# Altium footprint library PcbLib1.PcbLib: 212 footprints (part 4 of 14)
Each footprint in its own frame and in the unit in brackets; x right, y up, seen from the top. Pads: shape width x height; smd on the part's side, far side on the other; paste and mask are expansions set on the pad; w line width, h text height; cw(c..) or ccw(c..) is an arc to the next point about the centre after c.
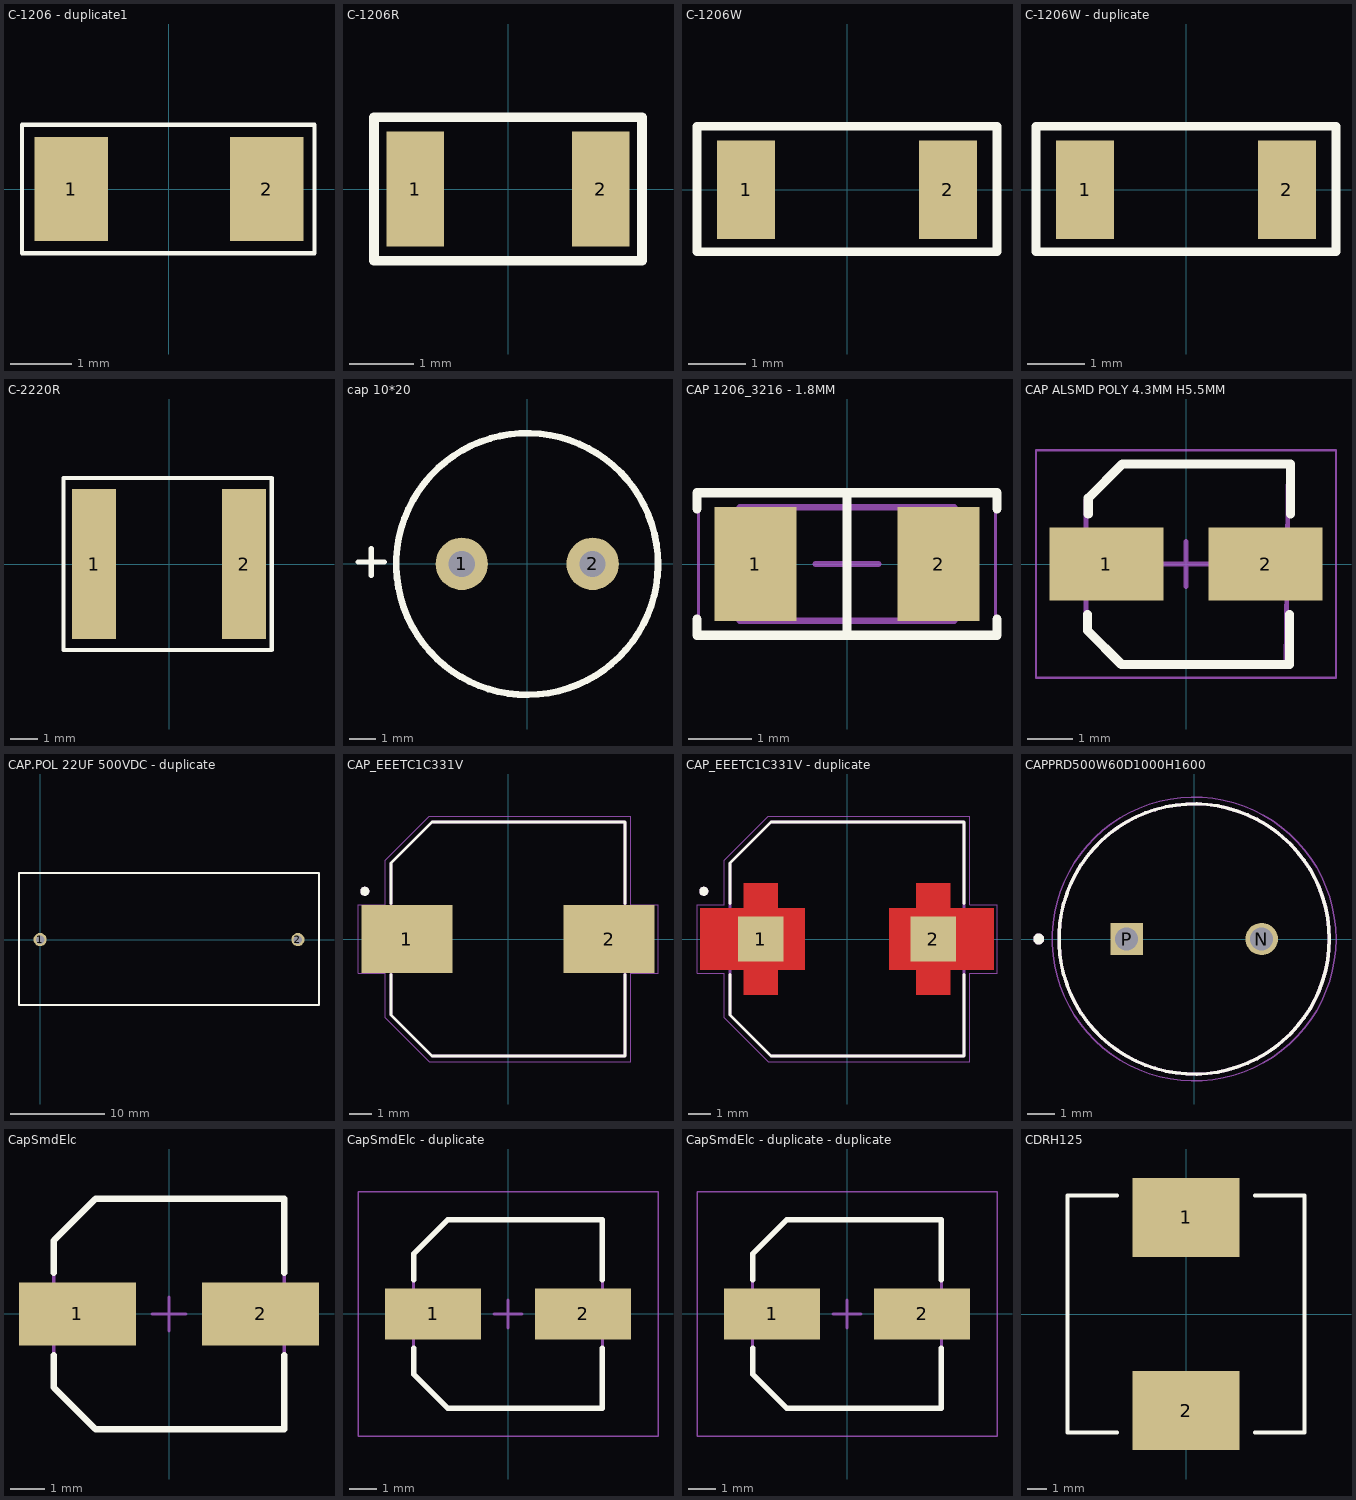
[diagram p3: the footprints below, top view; thin cyan lines are the x and y axes]

## C-1206 - duplicate1 [mm]
pads (2):
  rect 1.2x1.7 smd: 1(-1.6,0) 2(1.6,0)
Top Overlay:
  lines w0.07: -2.4,-1.05 -2.4,1.05 2.375,1.05 2.375,0.692 2.375,0.556 2.375,-0.531 2.375,-1.05 -2.4,-1.05
3D body "User Library-CAPC3216X10.STEP": height 1, standoff 0, extent -1.6,-0.8 1.6,0.8

## C-1206R [mm] "capacitor 1206 reflow soldering"
pads (2):
  rect 0.9x1.8 smd: 1(-1.45,0) 2(1.45,0)
Top Overlay:
  lines w0.152: -2.1,-1.125 -2.1,1.125 1.13,1.125 2.1,1.125 2.1,-1.125 -2.1,-1.125
3D body "CAP1206.stp": height 1, standoff 0, extent -1.6,-0.8 1.6,0.8

## C-1206W [mm] "capacitor 1206 wave soldering"
pads (2):
  rect 1x1.7 smd: 1(-1.75,0) 2(1.75,0)
Top Overlay:
  lines w0.152: -2.6,-1.075 2.45,-1.075 2.6,-1.075 2.6,1.1 -2.6,1.1 -2.6,-1.075
3D body "CAP1206.stp": height 1, standoff 0, extent -1.6,-0.8 1.6,0.8

## C-1206W - duplicate [mm] "capacitor 1206 wave soldering"
pads (2):
  rect 1x1.7 smd: 1(-1.75,0) 2(1.75,0)
Top Overlay:
  lines w0.152: -2.6,-1.075 -2.6,1.1 2.6,1.1 2.6,-1.075 2.45,-1.075 -2.6,-1.075
3D body "CAP1206.stp": height 1, standoff 0, extent -1.6,-0.8 1.6,0.8

## C-2220R [mm] "capacitor 2220 reflow soldering"
pads (2):
  rect 1.6x5.4 smd: 1(-2.7,0) 2(2.7,0)
Top Overlay:
  lines w0.152: 2.15,-3.1 3.7,-3.1 3.7,3.1 2.15,3.1 ; 2.275,-3.1 -3.8,-3.1 -3.8,3.1 2.525,3.1
3D body "CAP2220.stp": height 2.24, standoff -0.04, extent -2.85,-2.5 2.85,2.5

## cap 10*20 [mm]
pads (2):
  round 2 hole 1: 1(-2.5,0) 2(2.5,0)
Top Overlay:
  lines w0.2: -6.466,0.075 -5.45,0.075 ; -5.958,-0.433 -5.958,0.583
  lines w0.254: 4.996,-0.08 cw(c-0.003,-0.004) 4.997,-0.004
3D body "User Library-CE_R200_D400_H800.STEP": height 20.33, standoff -2.89, extent -5.225,-5.025 4.935,5.134

## CAP 1206_3216 - 1.8MM [mm] "Chip Capacitor, 2-Leads, Body 3.25x1.60mm, IPC Medium Density"
height 1.8
pads (2):
  rect 1.3x1.8 smd: 1(-1.45,0) 2(1.45,0)
Top Overlay:
  lines w0.15: -2.375,-0.875 -2.375,-1.125 2.375,-1.125 2.375,-0.875 ; -2.375,0.875 -2.375,1.125 2.375,1.125 2.375,0.875 ; 0,-1.125 0,1.125
Mechanical 13:
  lines w0.1: -1.7,-0.9 1.7,-0.9 1.7,0.9 -1.7,0.9 -1.7,-0.9
Mechanical 15:
  lines w0.05: -2.35,-1.15 2.35,-1.15 2.35,1.15 -2.35,1.15 -2.35,-1.15
  lines w0.1: -0.5,0 0.5,0 ; 0,-0.5 0,0.5
3D body "CAP 1206-1.8mm.STEP": height 1.8, standoff 0, extent -1.6,-0.8 1.6,0.8

## CAP ALSMD POLY 4.3MM H5.5MM [mm] "Aluminum Polymer Capacitor, Body 4.30x4.30x5.50mm, IPC Low Density"
height 5.5
pads (2):
  rect 2.5x1.6 smd: 1(-1.75,0) 2(1.75,0)
Top Overlay:
  lines w0.2: -2.17,-1.112 -2.17,-1.462 -1.42,-2.212 2.28,-2.212 2.28,-1.112 ; -2.15,1.1 -2.15,1.45 -1.4,2.2 2.3,2.2 2.3,1.1
Mechanical 13:
  lines w0.1: -2.2,-1.4 -2.2,1.4 -1.4,2.2 2.25,2.2 2.2,-2.2 -1.4,-2.2 -2.2,-1.4
Mechanical 15:
  lines w0.05: -3.3,-2.5 3.3,-2.5 3.3,2.5 -3.3,2.5 -3.3,-2.5
  lines w0.1: -0.5,0 0.5,0 ; 0,-0.5 0,0.5
3D body "CAP ALSMD - POLY - 4.3 x 4.3 x 5.5.step": height 5.5, standoff 0, extent -2.3,-2.2 2.3,2.2

## CAP.POL 22UF 500VDC - duplicate [mm]
pads (2):
  round 1.4 hole 0.9: 1(0,0) 2(27.5,0)
Top Overlay:
  lines w0.2: -2.25,-6.985 -2.25,-5.807 -2.25,5.693 -2.25,7.112 29.75,7.112 29.75,-6.985 -2.25,-6.985
3D body "c-rect_p27-5_l30_w13_h23.stp": height 23.01, standoff -3.99, extent -1.225,-6.45 28.775,6.55

## CAP_EEETC1C331V [mm]
pads (2):
  rect 4x3 smd paste-2 mask+0: 1(-4.445,0) 2(4.445,0)
Top Overlay:
  circle w0.2: c-6.3,2.1 r0.1
  lines w0.127: -5.15,-1.57 -5.15,-3.35 -3.35,-5.15 5.15,-5.15 5.15,-1.57 ; -5.15,1.57 -5.15,3.35 -3.35,5.15 5.15,5.15 5.15,1.57
Mechanical 13:
  circle w0.2: c-6.3,2.1 r0.1
  lines w0.127: -5.15,-3.35 -3.35,-5.15 5.15,-5.15 5.15,5.15 -3.35,5.15 -5.15,3.35 -5.15,-3.35
Mechanical 15:
  lines w0.05: -6.6,-1.5 -6.6,1.5 -5.4,1.5 -5.4,3.475 -3.475,5.4 5.4,5.4 5.4,1.5 6.6,1.5 6.6,-1.5 5.4,-1.5 5.4,-5.4 -3.475,-5.4 -5.4,-3.475 -5.4,-1.5 -6.6,-1.5
3D body "step_temp.STEP": height 10.52, standoff 0.02, extent -5.85,-5.15 5.85,5.15

## CAP_EEETC1C331V - duplicate [mm]
pads (2):
  rect 2x2 smd paste-2 mask+0: 1(-3.8,0) 2(3.8,0)
Top Layer:
  region: 4.55,1.35 6.45,1.35 6.45,-1.35 4.55,-1.35 4.55,-2.45 3.05,-2.45 3.05,-1.35 1.85,-1.35 1.85,1.35 3.05,1.35 3.05,2.45 4.55,2.45
  region: -3.05,1.35 -1.85,1.35 -1.85,-1.35 -3.05,-1.35 -3.05,-2.45 -4.55,-2.45 -4.55,-1.35 -6.45,-1.35 -6.45,1.35 -4.55,1.35 -4.55,2.45 -3.05,2.45
  region: -3.15,1.25 -1.95,1.25 -1.95,-1.25 -3.15,-1.25 -3.15,-2.35 -4.45,-2.35 -4.45,-1.25 -6.35,-1.25 -6.35,1.25 -4.45,1.25 -4.45,2.35 -3.15,2.35
  region: 4.45,1.25 6.35,1.25 6.35,-1.25 4.45,-1.25 4.45,-2.35 3.15,-2.35 3.15,-1.25 1.95,-1.25 1.95,1.25 3.15,1.25 3.15,2.35 4.45,2.35
Top Overlay:
  circle w0.2: c-6.3,2.1 r0.1
  lines w0.127: -5.15,-1.57 -5.15,-3.35 -3.35,-5.15 5.15,-5.15 5.15,-1.57 ; -5.15,1.57 -5.15,3.35 -3.35,5.15 5.15,5.15 5.15,1.57
Top Paste:
  region: -3.15,1.25 -1.95,1.25 -1.95,-1.25 -3.15,-1.25 -3.15,-2.35 -4.45,-2.35 -4.45,-1.25 -6.35,-1.25 -6.35,1.25 -4.45,1.25 -4.45,2.35 -3.15,2.35
  region: 4.45,1.25 6.35,1.25 6.35,-1.25 4.45,-1.25 4.45,-2.35 3.15,-2.35 3.15,-1.25 1.95,-1.25 1.95,1.25 3.15,1.25 3.15,2.35 4.45,2.35
Mechanical 13:
  circle w0.2: c-6.3,2.1 r0.1
  lines w0.127: -5.15,-3.35 -5.15,3.35 -3.35,5.15 5.15,5.15 5.15,-5.15 -3.35,-5.15 -5.15,-3.35
Mechanical 15:
  lines w0.05: -6.6,-1.5 -5.4,-1.5 -5.4,-3.475 -3.475,-5.4 5.4,-5.4 5.4,-1.5 6.6,-1.5 6.6,1.5 5.4,1.5 5.4,5.4 -3.475,5.4 -5.4,3.475 -5.4,1.5 -6.6,1.5 -6.6,-1.5
3D body "step_temp.STEP": height 10.52, standoff 0.02, extent -5.85,-5.15 5.85,5.15

## CAPPRD500W60D1000H1600 [mm]
pads (2):
  round 1.2 hole 0.85: N(2.5,0)
  rect 1.2x1.2 hole 0.85: P(-2.5,0)
Top Overlay:
  circle w0.2: c-5.75,0 r0.1
  circle w0.127: c0,0 r5
Mechanical 13:
  circle w0.2: c-5.75,0 r0.1
  circle w0.127: c0,0 r5
Mechanical 15:
  circle w0.05: c0,0 r5.25
3D body "step_temp.STEP": height 16, standoff -17, extent -5,-4.999 5,4.999

## CapSmdElc [mm] "Aluminum Electrolytic Capacitor, Body 6.70x6.70x6.30mm, IPC Low Density"
height 6.3
pads (2):
  rect 3.45x1.85 smd: 1(-2.7,0) 2(2.7,0)
Top Overlay:
  lines w0.2: -3.4,-1.225 -3.4,-2.163 -2.163,-3.4 3.4,-3.4 3.4,-1.225 ; -3.4,1.225 -3.4,2.163 -2.163,3.4 3.4,3.4 3.4,1.225
Top Courtyard:
  lines w0.1: -0.5,0 0.5,0 ; 0,-0.5 0,0.5
Top Assembly:
  lines w0.1: -3.4,-2.163 -2.163,-3.4 3.4,-3.4 3.4,3.4 -2.163,3.4 -3.4,2.163 -3.4,-2.163
3D body "User Library-Nichicon_CW6_3x7.STEP": height 6.92, standoff 0.01, extent -3.45,-3.275 3.55,3.325

## CapSmdElc - duplicate [mm] "Aluminum Electrolytic Capacitor, Body 6.70x6.70x6.30mm, IPC Low Density"
height 6.3
pads (2):
  rect 3.45x1.85 smd: 1(-2.7,0) 2(2.7,0)
Top Overlay:
  lines w0.2: -3.4,-1.225 -3.4,-2.163 -2.163,-3.4 3.4,-3.4 3.4,-1.225 ; -3.4,1.225 -3.4,2.163 -2.163,3.4 3.4,3.4 3.4,1.225
Top Courtyard:
  lines w0.05: -5.4,-4.4 5.4,-4.4 5.4,4.4 -5.4,4.4 -5.4,-4.4
  lines w0.1: -0.5,0 0.5,0 ; 0,-0.5 0,0.5
Top Assembly:
  lines w0.1: -3.4,-2.163 -3.4,2.163 -2.163,3.4 3.4,3.4 3.4,-3.4 -2.163,-3.4 -3.4,-2.163
3D body "User Library-Nichicon_CW6_3x7.STEP": height 6.92, standoff 0.01, extent -3.45,-3.275 3.55,3.325

## CapSmdElc - duplicate - duplicate [mm] "Aluminum Electrolytic Capacitor, Body 6.70x6.70x6.30mm, IPC Low Density"
height 6.3
pads (2):
  rect 3.45x1.85 smd: 1(-2.7,0) 2(2.7,0)
Top Overlay:
  lines w0.2: -3.4,-1.225 -3.4,-2.163 -2.163,-3.4 3.4,-3.4 3.4,-1.225 ; -3.4,1.225 -3.4,2.163 -2.163,3.4 3.4,3.4 3.4,1.225
Top Courtyard:
  lines w0.05: -5.4,-4.4 -5.4,4.4 5.4,4.4 5.4,-4.4 -5.4,-4.4
  lines w0.1: -0.5,0 0.5,0 ; 0,-0.5 0,0.5
Top Assembly:
  lines w0.1: -3.4,-2.163 -2.163,-3.4 3.4,-3.4 3.4,3.4 -2.163,3.4 -3.4,2.163 -3.4,-2.163
3D body "User Library-Nichicon_CW6_3x7.STEP": height 6.92, standoff 0.01, extent -3.45,-3.275 3.55,3.325

## CDRH125 [mm] "CDRH125"
pads (2):
  rect 5.4x4 smd: 1(0,4.9) 2(0,-4.9)
Top Overlay:
  lines w0.203: -3.5,-6 -6,-6 -6,6 -3.5,6 ; 3.5,-6 6,-6 6,6 3.5,6